# Altium footprint library PcbLib1.PcbLib: 49 footprints (part 3 of 4)
Each footprint in its own frame and in the unit in brackets; x right, y up, seen from the top. Pads: shape width x height; smd on the part's side, far side on the other; paste and mask are expansions set on the pad; w line width, h text height; cw(c..) or ccw(c..) is an arc to the next point about the centre after c.
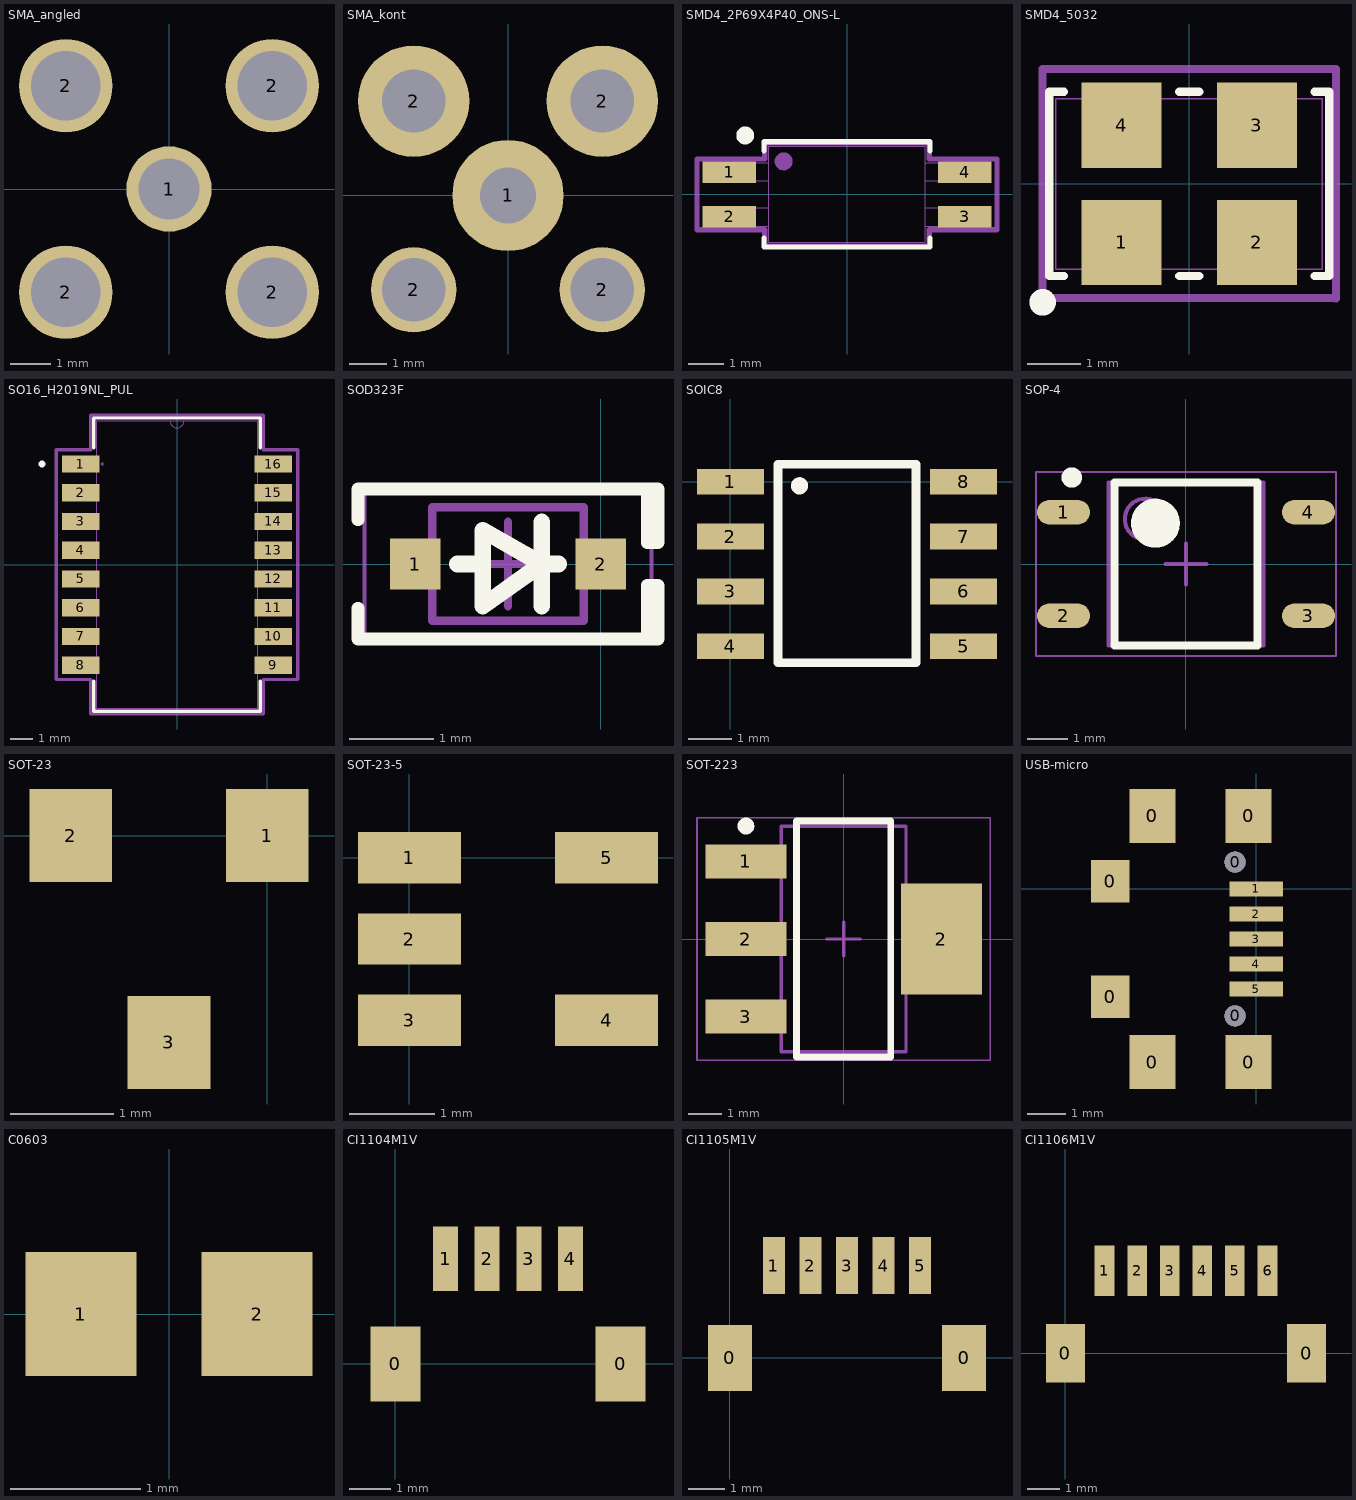
[diagram p2: the footprints below, top view; thin cyan lines are the x and y axes]

## SMA_angled [mm]
pads (5):
  round 2.1 hole 1.5: 1(0,0)
  round 2.3 hole 1.7: 2(-2.54,-2.54) 2(-2.54,2.54) 2(2.54,-2.54) 2(2.54,2.54)
3D body "SMA ANGLED.STEP": height 9.9, standoff -3.9, extent -3.5,-3.5 3.5,11

## SMA_kont [mm]
pads (5):
  round 3 hole 1.5: 1(0,0)
  round 2.3 hole 1.7: 2(-2.54,-2.54) 2(2.54,-2.54)
  round 3 hole 1.7: 2(-2.54,2.54) 2(2.54,2.54)

## SMD4_2P69X4P40_ONS-L [mm]
height 1
pads (4):
  rect 1.5x0.6 smd paste+0 mask+0: 1(-3.3,0.625) 2(-3.3,-0.625) 3(3.3,-0.625) 4(3.3,0.625)
Top Overlay:
  circle w0.25: c-2.85,1.65 r0.125
  lines w0.152: -2.324,-1.222 -2.324,-1.473 2.324,-1.473 2.324,-1.222 ; -2.324,1.222 -2.324,1.473 2.324,1.473 2.324,1.222
Mechanical 13:
  circle w0.25: c-1.775,0.925 r0.125
  lines w0.025: -2.197,0.381 -3.645,0.381 -3.645,0.889 -2.197,0.889 ; -3.645,-0.889 -2.197,-0.889 -2.197,-0.381 -3.645,-0.381 -3.645,-0.889 ; -2.197,-1.346 -2.197,1.346 2.197,1.346 2.197,-1.346 -2.197,-1.346 ; 2.197,-0.889 3.645,-0.889 3.645,-0.381 2.197,-0.381 2.197,-0.889 ; 2.197,0.381 3.645,0.381 3.645,0.889 2.197,0.889 2.197,0.381
Mechanical 15:
  lines w0.152: -4.2,-0.991 -2.299,-0.991 -2.299,-1.448 2.299,-1.448 2.299,-0.991 4.2,-0.991 4.2,0.991 2.299,0.991 2.299,1.448 -2.299,1.448 -2.299,0.991 -4.2,0.991 -4.2,-0.991
3D body "SMD4_2P69X4P40_ONS.step": height 2.39, standoff 0, extent -3.645,-1.346 3.645,1.346

## SMD4_5032 [mm]
height 1
pads (4):
  rect 1.5x1.6 smd paste-0.75 mask+0: 1(-1.27,-1.1) 2(1.27,-1.1) 3(1.27,1.1) 4(-1.27,1.1)
Top Overlay:
  circle w0.25: c-2.75,-2.225 r0.125
  lines w0.152: -2.353,-1.727 -2.627,-1.727 -2.627,1.727 -2.353,1.727 ; -0.187,-1.727 0.187,-1.727 ; -0.187,1.727 0.187,1.727 ; 2.353,-1.727 2.627,-1.727 2.627,1.727 2.353,1.727
Mechanical 13:
  lines w0.025: -2.5,-1.6 2.5,-1.6 2.5,1.6 -2.5,1.6 -2.5,-1.6
Mechanical 15:
  lines w0.152: -2.754,-2.154 -2.754,2.154 2.754,2.154 2.754,-2.154 ; -2.754,-2.146 2.754,-2.146
3D body "CDFN4_5X3P2_MCH.step": height 0.85, standoff 0, extent -2.5,-1.6 2.5,1.6

## SO16_H2019NL_PUL [mil]
pads (16):
  rect 65x30 smd paste+0 mask+0: 1(-167.5,175) 2(-167.5,125) 3(-167.5,75) 4(-167.5,25) 5(-167.5,-25) 6(-167.5,-75) 7(-167.5,-125) 8(-167.5,-175) 9(167.5,-175) 10(167.5,-125) 11(167.5,-75) 12(167.5,-25) 13(167.5,25) 14(167.5,75) 15(167.5,125) 16(167.5,175)
Top Overlay:
  circle w6: c-235,175 r3
  lines w6: -145,-203.1 -145,-255 145,-255 145,-203.1 ; -145,203.1 -145,255 145,255 145,203.1
Mechanical 13:
  circle w0: c-130,175 r1.5
  lines w0: -12,250 ccw(c0,250) 12,250
  lines w1: -140,-250 140,-250 140,250 -140,250 -140,-250
Mechanical 15:
  lines w6: -210,-200 -210,200 -150,200 -150,260 150,260 150,200 210,200 210,-200 150,-200 150,-260 -150,-260 -150,-200 -210,-200
3D body: height 10, standoff 0, extent 0,0 10,10
3D body "SO16_H2019NL_PUL.step": height 235.12, standoff 0, extent -186.22,-250 186.22,250

## SOD323F [mm] "SODFL, 2-Leads, Body 1.25x2.50mm, IPC Medium Density"
height 0.8
pads (2):
  rect 0.6x0.6 smd: 1(-2.2,0) 2(0,0)
Top Overlay:
  lines w0.15: -2.878,-0.525 -2.878,-0.889 0.678,-0.889 0.678,-0.254 0.551,-0.254 0.551,-0.889 ; -2.878,0.525 -2.878,0.889 0.678,0.889 0.678,0.254 0.551,0.254 0.551,0.889
  lines w0.2: -1.7,0 -1.4,0 ; -0.7,-0.5 -0.7,0.5 ; -0.5,0 -0.7,0 ; -0.7,0 -1.4,0.4 -1.4,-0.5 -0.7,0
Mechanical 13:
  lines w0.1: -2,-0.675 -2,0.675 -0.2,0.675 -0.2,-0.675 -2,-0.675
Mechanical 15:
  lines w0.05: -2.8,-0.85 -2.8,0.85 0.6,0.85 0.6,-0.85 -2.8,-0.85
  lines w0.1: -1.6,0 -0.6,0 ; -1.1,-0.5 -1.1,0.5
3D body "SOD323F.STEP": height 0.8, standoff 0, extent -2.35,-0.625 0.15,0.625

## SOIC8 [mm]
pads (8):
  rect 1.55x0.6 smd: 1(0,0) 2(0,-1.27) 3(0,-2.54) 4(0,-3.81) 5(5.4,-3.81) 6(5.4,-2.54) 7(5.4,-1.27) 8(5.4,0)
Top Layer:
  region: 0,0
Top Overlay:
  circle w0.2: c1.6,-0.095 r0.1
  lines w0.2: 1.1,-4.195 1.1,0.405 4.3,0.405 4.3,-4.195 1.1,-4.195
3D body "SOIC-8-1.step": height 1.75, standoff 0, extent -0.3,-4.355 5.7,0.545

## SOP-4 [mm] "SOP, 4-Leads, Body 4,00x3,80mm, Pitch 2,54mm, IPC Medium Density"
height 2.18
pads (4):
  oval 1.3x0.6 smd: 1(-3,1.27) 2(-3,-1.27) 3(3,-1.27) 4(3,1.27)
Top Overlay:
  circle w0.6: c-0.75,1 r0.3
  circle w0.25: c-2.8,2.12 r0.125
  lines w0.2: -1.75,-2 1.75,-2 1.75,2 -1.75,2 -1.75,-2
Mechanical 13:
  circle w0.1: c-1,1.1 r0.5
  lines w0.1: -1.9,-2 1.9,-2 1.9,2 -1.9,2 -1.9,-2
Mechanical 15:
  lines w0.05: -3.675,-2.25 3.675,-2.25 3.675,2.25 -3.675,2.25 -3.675,-2.25
  lines w0.1: -0.5,0 0.5,0 ; 0,-0.5 0,0.5
3D body "4-SOP.STEP": height 2.1, standoff 0, extent -3.4,-2.15 3.4,2.15

## SOT-23 [mm]
pads (3):
  rect 0.8x0.9 smd: 1(0,0) 2(-1.9,0) 3(-0.95,-2)
3D body "SOT-23.stp": height 0.98, standoff 0, extent -2.41,-2.2 0.51,0.2

## SOT-23-5 [mm]
pads (5):
  rect 1.2x0.6 smd: 1(0,0) 2(0,-0.95) 3(0,-1.9) 4(2.3,-1.9) 5(2.3,0)
3D body "User Library-SOT23-5-1.step": height 1.3, standoff 0, extent -0.35,-2.45 2.65,0.55

## SOT-223 [mm] "SOT223, 4-Leads, Body 6,50x7,00mm (avg), Pitch 2,30mm, IPC Medium Density"
height 1.8
pads (4):
  rect 2.4x1 smd: 1(-2.9,2.3) 2(-2.9,0) 3(-2.9,-2.3)
  rect 2.4x3.3 smd: 2(2.9,0)
Top Overlay:
  circle w0.25: c-2.9,3.35 r0.125
  lines w0.2: -1.4,-3.5 1.4,-3.5 1.4,3.5 -1.4,3.5 -1.4,-3.5
Mechanical 13:
  lines w0.1: -1.85,-3.35 1.85,-3.35 1.85,3.35 -1.85,3.35 -1.85,-3.35
Mechanical 15:
  lines w0.05: -4.35,-3.6 4.35,-3.6 4.35,3.6 -4.35,3.6 -4.35,-3.6
  lines w0.1: -0.5,0 0.5,0 ; 0,-0.5 0,0.5
3D body "User Library-SOT-223-1.step": height 1.64, standoff -0.01, extent -3.5,-3.25 3.5,3.25

## USB-micro [mm]
pads (13):
  rect 1x1.1 smd: 0(-3.8,-2.8) 0(-3.8,0.2)
  rect 1.2x1.4 smd: 0(-2.7,-4.5) 0(-2.7,1.9) 0(-0.2,-4.5) 0(-0.2,1.9)
  round 0.55 hole 0.55 unplated paste+0 mask+0: 0(-0.55,-3.3) 0(-0.55,0.7)
  rect 1.4x0.4 smd: 1(0,0) 2(0,-0.65) 3(0,-1.3) 4(0,-1.95) 5(0,-2.6)
3D body "MICRO-USB.stp": height 2.83, standoff -0.23, extent -5.5,-5.7 0.1,3.1

## С0603 [mm]
pads (2):
  rect 0.85x0.95 smd: 1(-0.675,0) 2(0.675,0)
3D body "cap0603.step": height 0.9, standoff 0, extent -0.8,-0.4 0.8,0.4

## СI1104М1V [mm] "4pin"
pads (6):
  rect 1.2x1.8 smd: 0(0,0) 0(5.4,0)
  rect 0.6x1.55 smd: 1(1.2,2.525) 2(2.2,2.525) 3(3.2,2.525) 4(4.2,2.525)

## СI1105М1V [mm] "5pin"
pads (7):
  rect 1.2x1.8 smd: 0(0,0) 0(6.4,0)
  rect 0.6x1.55 smd: 1(1.2,2.525) 2(2.2,2.525) 3(3.2,2.525) 4(4.2,2.525) 5(5.2,2.525)

## СI1106М1V [mm] "6pin"
pads (8):
  rect 1.2x1.8 smd: 0(0,0) 0(7.4,0)
  rect 0.6x1.55 smd: 1(1.2,2.525) 2(2.2,2.525) 3(3.2,2.525) 4(4.2,2.525) 5(5.2,2.525) 6(6.2,2.525)